# Altium footprint library Connector_art.PcbLib: 209 footprints (part 11 of 14)
Each footprint in its own frame and in the unit in brackets; x right, y up, seen from the top. Pads: shape width x height; smd on the part's side, far side on the other; paste and mask are expansions set on the pad; w line width, h text height; cw(c..) or ccw(c..) is an arc to the next point about the centre after c.
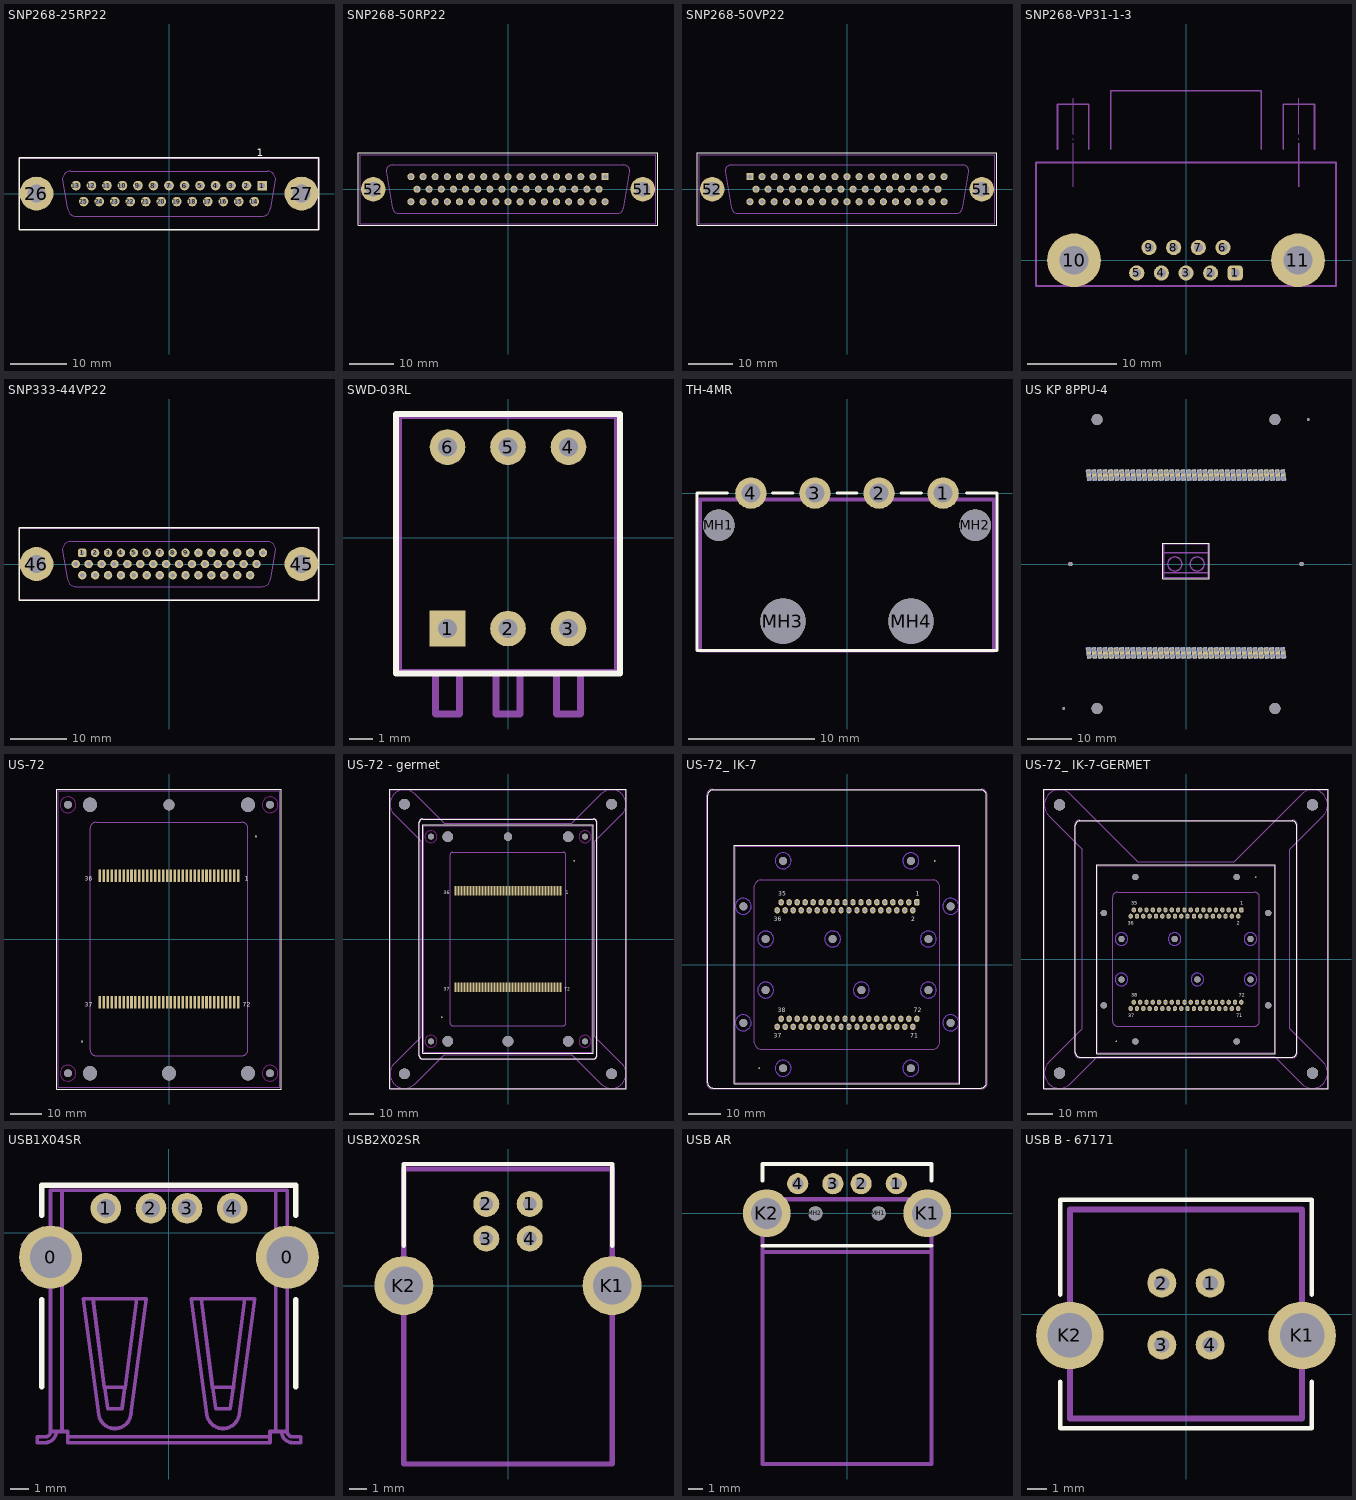
[diagram p10: the footprints below, top view; thin cyan lines are the x and y axes]

## SNP268-25RP22 [mm]
pads (27):
  rect 1.7x1.7 hole 1: 1(16.5,1.42)
  round 1.7 hole 1: 2(13.75,1.42) 3(11,1.42) 4(8.25,1.42) 5(5.5,1.42) 6(2.75,1.42) 7(0,1.42) 8(-2.75,1.42) 9(-5.5,1.42) 10(-8.25,1.42) 11(-11,1.42) 12(-13.75,1.42) 13(-16.5,1.42) 14(15.125,-1.42) 15(12.375,-1.42) 16(9.625,-1.42) 17(6.875,-1.42) 18(4.125,-1.42) 19(1.375,-1.42) 20(-1.375,-1.42) 21(-4.125,-1.42) 22(-6.875,-1.42) 23(-9.625,-1.42) 24(-12.375,-1.42) 25(-15.125,-1.42)
  round 6 hole 3.2: 26(-23.5,0) 27(23.5,0)
Top Overlay:
  lines w0.25: -26.6,-6.4 -26.6,6.4 26.6,6.4 26.6,6.3 26.6,-6.4 -26.6,-6.4
  text "1" at 15.56,6.655 h1.38
Mechanical 1:
  circle w0.13: c-23.5,0 r1.5
  circle w0.13: c23.5,0 r1.5
  lines w0.025: -26,0 -21,0 ; -23.5,-2.5 -23.5,2.5 ; 21,0 26,0 ; 23.5,-2.5 23.5,2.5
  lines w0.13: -18,-2.6 -18.9,2.5 cw(c-17.4,2.5) -17.4,4 17.4,4 cw(c17.4,2.5) 18.9,2.5 18,-2.7 ; -18,-2.5 ccw(c-16.5,-2.5) -16.5,-4 ; -16.6,-4 16.5,-4 ccw(c16.5,-2.5) 18,-2.5 ; -26.5,-6.3 -26.5,6.3 26.5,6.3 26.5,-6.3 -26.5,-6.3
  text "13" at -18.124,0.243 h2.12
  text "1" at 16.772,0.243 h2.12
  text "25" at -17.124,-2.757 h2.12
  text "14" at 14.876,-2.757 h2.12
3D body: height 12.4, standoff -3.2, extent -26.6,-6.25 26.6,6.25

## SNP268-50RP22 [mm]
pads (52):
  rect 1.6x1.6 hole 1: 1(22,2.84)
  round 1.6 hole 1: 2(19.25,2.84) 3(16.5,2.84) 4(13.75,2.84) 5(11,2.84) 6(8.25,2.84) 7(5.5,2.84) 8(2.75,2.84) 9(0,2.84) 10(-2.75,2.84) 11(-5.5,2.84) 12(-8.25,2.84) 13(-11,2.84) 14(-13.75,2.84) 15(-16.5,2.84) 16(-19.25,2.84) 17(-22,2.84) 18(20.625,0) 19(17.875,0) 20(15.125,0) 21(12.375,0) 22(9.625,0) 23(6.875,0) 24(4.125,0) 25(1.375,0) 26(-1.375,0) 27(-4.125,0) 28(-6.875,0) 29(-9.625,0) 30(-12.375,0) 31(-15.125,0) 32(-17.875,0) 33(-20.625,0) 34(22,-2.84) 35(19.25,-2.84) 36(16.5,-2.84) 37(13.75,-2.84) 38(11,-2.84) 39(8.25,-2.84) 40(5.5,-2.84) 41(2.75,-2.84) 42(0,-2.84) 43(-2.75,-2.84) 44(-5.5,-2.84) 45(-8.25,-2.84) 46(-11,-2.84) 47(-13.75,-2.84) 48(-16.5,-2.84) 49(-19.25,-2.84) 50(-22,-2.84)
  round 5.5 hole 3.2: 51(30.55,0) 52(-30.55,0)
Top Overlay:
  lines w0.25: -34,-8.2 34,-8.2 34,8.3 -34,8.3 -34,-8.2
Mechanical 1:
  lines w0.13: -26.2,-4.2 -27.65,4 cw(c-26.15,4) -26.15,5.5 ; -26.2,5.5 26.2,5.5 ; -26.193,-4.149 ccw(c-24.7,-4) -24.7,-5.5 24.7,-5.5 ccw(c24.7,-4) 26.193,-4.149 ; 26.15,5.5 cw(c26.15,4) 27.65,4 26.2,-4.2
  lines w0.2: -33.5,-7.8 33.5,-7.8 33.5,7.8 -33.5,7.8 -33.5,-7.8
  text "18" at 21.876,-1.457 h2.12
  text "33" at -24.124,-1.457 h2.12
  text "34" at 23.376,-3.957 h2.12
  text "50" at -25.124,-3.957 h2.12
  text "1" at 23.772,1.543 h2.12
  text "17" at -25.124,1.543 h2.12
3D body: height 12.4, standoff -3.2, extent -33.5,-7.7 33.5,7.7

## SNP268-50VP22 [mm]
pads (52):
  rect 1.6x1.6 hole 1: 1(-22,2.84)
  round 1.6 hole 1: 2(-19.25,2.84) 3(-16.5,2.84) 4(-13.75,2.84) 5(-11,2.84) 6(-8.25,2.84) 7(-5.5,2.84) 8(-2.75,2.84) 9(0,2.84) 10(2.75,2.84) 11(5.5,2.84) 12(8.25,2.84) 13(11,2.84) 14(13.75,2.84) 15(16.5,2.84) 16(19.25,2.84) 17(22,2.84) 18(-20.625,0) 19(-17.875,0) 20(-15.125,0) 21(-12.375,0) 22(-9.625,0) 23(-6.875,0) 24(-4.125,0) 25(-1.375,0) 26(1.375,0) 27(4.125,0) 28(6.875,0) 29(9.625,0) 30(12.375,0) 31(15.125,0) 32(17.875,0) 33(20.625,0) 34(-22,-2.84) 35(-19.25,-2.84) 36(-16.5,-2.84) 37(-13.75,-2.84) 38(-11,-2.84) 39(-8.25,-2.84) 40(-5.5,-2.84) 41(-2.75,-2.84) 42(0,-2.84) 43(2.75,-2.84) 44(5.5,-2.84) 45(8.25,-2.84) 46(11,-2.84) 47(13.75,-2.84) 48(16.5,-2.84) 49(19.25,-2.84) 50(22,-2.84)
  round 5.5 hole 3.2: 51(30.55,0) 52(-30.55,0)
Top Overlay:
  lines w0.25: -34,-8.2 -34,8.3 34,8.3 34,-8.2 -34,-8.2
Mechanical 1:
  lines w0.13: -26.2,-4.2 -27.65,4 cw(c-26.15,4) -26.15,5.5 ; -26.2,5.5 26.2,5.5 ; -26.193,-4.149 ccw(c-24.7,-4) -24.7,-5.5 24.7,-5.5 ccw(c24.7,-4) 26.193,-4.149 ; 26.15,5.5 cw(c26.15,4) 27.65,4 26.2,-4.2
  lines w0.2: -33.5,-7.8 -33.5,7.8 33.5,7.8 33.5,-7.8 -33.5,-7.8
  text "1" at -24.728,1.543 h2.12
  text "17" at 23.376,1.543 h2.12
  text "24" at -25.124,-3.957 h2.12
  text "50" at 23.376,-3.957 h2.12
  text "18" at -24.124,-1.457 h2.12
  text "33" at 21.876,-1.457 h2.12
3D body: height 12.4, standoff -4, extent -33.5,-7.855 33.5,7.845

## SNP268-VP31-1-3 [mm]
height 12.6
pads (11):
  rrect50% 1.7x1.7 hole 1: 1(5.5,-1.42)
  round 1.7 hole 1: 2(2.75,-1.42) 3(0,-1.42) 4(-2.75,-1.42) 5(-5.5,-1.42) 6(4.125,1.42) 7(1.375,1.42) 8(-1.375,1.42) 9(-4.125,1.42)
  round 6 hole 3.2: 10(-12.5,0) 11(12.5,0)
Mechanical 1:
  circle w0.2: c12.465,-0.055 r1.6
  circle w0.2: c-12.5,-0.08 r1.6
  lines w0.1: -14.62,0 -10.39,0 ; -12.6,8.22 -12.6,13.055 ; -12.6,13.485 -12.6,13.58 ; -12.6,14.095 -12.6,18.12 ; -12.5,2.32 -12.495,-2.32 ; 10.08,-0.005 14.875,0 ; 12.505,2.45 12.51,-2.42 ; 12.595,13.045 12.6,8.21 ; 12.595,13.475 12.595,13.57 ; 12.595,14.085 12.595,18.11
  lines w0.2: -14.35,12.42 -14.35,17.42 -10.85,17.42 -10.85,12.42 ; -8.4,12.42 -8.4,18.92 8.4,18.92 8.4,12.42 ; 10.85,12.42 10.85,17.42 14.35,17.42 14.35,12.42 ; -16.75,-2.88 16.75,-2.88 16.75,10.92 -16.75,10.92 -16.75,-2.88
  text "1" at 6.831,-2.224 h1.5
  text "5" at -8.149,-2.179 h1.5
  text "6" at 6.831,0.616 h1.5
  text "9" at -8.149,0.571 h1.5
Mechanical 2:
  circle w0.2: c12.47,-0.055 r1.6
  circle w0.2: c-12.5,-0.08 r1.6
  lines w0.1: -14.635,0 -10.375,0 ; -12.6,8.22 -12.6,13.055 ; -12.6,13.485 -12.6,13.58 ; -12.6,14.095 -12.6,18.12 ; -12.5,-2.265 -12.5,2.31 ; 10.09,0 14.875,0 ; 12.5,-2.32 12.505,2.42 ; 12.595,8.21 12.595,13.045 ; 12.595,13.475 12.595,13.57 ; 12.595,14.085 12.595,18.11
  lines w0.2: -14.35,12.42 -14.35,17.42 -10.85,17.42 -10.85,12.42 ; -8.4,12.42 -8.4,18.92 8.4,18.92 8.4,12.42 ; 10.85,12.42 10.85,17.42 14.35,17.42 14.35,12.42 ; -16.75,-2.88 16.75,-2.88 16.75,10.92 -16.75,10.92 -16.75,-2.88
3D body: height 14.21, standoff -2.59, extent -15.6,-3.33 15.6,17.87

## SNP333-44VP22 [mm]
pads (46):
  rrect50% 1.5x1.5 hole 0.8 unplated: 1(-15.39,1.98)
  round 1.5 hole 0.8: 2(-13.1,1.98) 3(-10.81,1.98) 4(-8.52,1.98) 5(-6.23,1.98) 6(-3.94,1.98) 7(-1.65,1.98) 8(0.64,1.98) 9(2.93,1.98) 10(5.22,1.98) 11(7.51,1.98) 12(9.8,1.98) 13(12.09,1.98) 14(14.38,1.98) 15(16.67,1.98) 16(-16.54,0) 17(-14.25,0) 18(-11.96,0) 19(-9.67,0) 20(-7.38,0) 21(-5.09,0) 22(-2.8,0) 23(-0.51,0) 24(1.78,0) 25(4.07,0) 26(6.36,0) 27(8.65,0) 28(10.94,0) 29(13.23,0) 30(15.52,0) 31(-15.39,-1.98) 32(-13.1,-1.98) 33(-10.81,-1.98) 34(-8.52,-1.98) 35(-6.23,-1.98) 36(-3.94,-1.98) 37(-1.65,-1.98) 38(0.64,-1.98) 39(2.93,-1.98) 40(5.22,-1.98) 41(7.51,-1.98) 42(9.8,-1.98) 43(12.09,-1.98) 44(14.38,-1.98)
  round 6 hole 3.2: 45(23.5,0) 46(-23.5,0)
Top Overlay:
  lines w0.25: -26.6,-6.4 -26.6,6.4 26.6,6.4 26.6,6.3 26.6,-6.4 -26.6,-6.4
Mechanical 1:
  circle w0.13: c-23.5,0 r1.5
  circle w0.13: c23.5,0 r1.5
  lines w0.025: -26,0 -21,0 ; -23.5,-2.5 -23.5,2.5 ; 21,0 26,0 ; 23.5,-2.5 23.5,2.5
  lines w0.13: -18,-2.6 -18.9,2.5 cw(c-17.4,2.5) -17.4,4 17.4,4 cw(c17.4,2.5) 18.9,2.5 18,-2.7 ; -18,-2.5 ccw(c-16.5,-2.5) -16.5,-4 ; -16.6,-4 16.5,-4 ccw(c16.5,-2.5) 18,-2.5 ; -26.5,-6.3 -26.5,6.3 26.5,6.3 26.5,-6.3 -26.5,-6.3
  text "16" at -18.124,-1.257 h2.12
  text "30" at 15.376,-1.257 h2.12
  text "1" at -17.228,0.743 h2.12
  text "15" at 15.876,0.743 h2.12
  text "31" at -17.124,-3.257 h2.12
  text "44" at 14.376,-3.257 h2.12

## SWD-03RL [mm]
height 10.3
pads (6):
  rect 1.5x1.5 hole 0.8 paste+0: 1(-2.54,-3.81)
  round 1.5 hole 0.8: 2(0,-3.81) 3(2.54,-3.81) 4(2.54,3.81) 5(0,3.81) 6(-2.54,3.81)
Top Overlay:
  lines w0.25: -4.7,-5.7 4.7,-5.7 4.7,5.2 -4.7,5.2 -4.7,-5.7
Mechanical 1:
  lines w0.3: -3.04,-5.65 -3.04,-7.4 -2.04,-7.4 -2.04,-5.65 ; -0.5,-5.65 -0.5,-7.4 0.5,-7.4 0.5,-5.65 ; 2.04,-5.65 2.04,-7.4 3.04,-7.4 3.04,-5.65 ; -4.6,-5.65 4.6,-5.65 4.6,5.15 -4.6,5.15 -4.6,-5.65
3D body: height 10.3, standoff -3.2, extent -4.6,-7.35 4.6,5.15

## TH-4MR [mm]
height 8.3
pads (8):
  round 2.5 hole 1.5: 1(7.62,0) 2(2.54,0) 3(-2.54,0) 4(-7.62,0)
  round 2.5 hole 2.5 unplated: MH1(-10.16,-2.54) MH2(10.16,-2.54)
  round 3.6 hole 3.6 unplated: MH3(-5.08,-10.16) MH4(5.08,-10.16)
Top Overlay:
  lines w0.25: -9.5,0 -11.9,0 -11.9,-12.5 11.9,-12.5 11.9,0 9.5,0 ; -5.9,0 -4.3,0 ; -0.8,0 0.8,0 ; 4.3,0 5.9,0
Mechanical 1:
  lines w0.3: -11.65,-12.5 -11.65,-0.5 11.65,-0.5 11.65,-12.5 -11.65,-12.5
3D body: height 8.3, standoff -4.15, extent -11.65,-12.5 11.65,0.5

## US KP 8PPU-4 [mm]
height 10
pads (296):
  round 1 hole 0.85: 1(21.8,20.625) 1(21.95,19.375) 2(20.55,20.625) 2(20.7,19.375) 3(19.3,20.625) 3(19.45,19.375) 4(18.05,20.625) 4(18.2,19.375) 5(16.8,20.625) 5(16.95,19.375) 6(15.55,20.625) 6(15.7,19.375) 7(14.3,20.625) 7(14.45,19.375) 8(13.05,20.625) 8(13.2,19.375) 9(11.8,20.625) 9(11.95,19.375) 10(10.55,20.625) 10(10.7,19.375) 11(9.3,20.625) 11(9.45,19.375) 12(8.05,20.625) 12(8.2,19.375) 13(6.8,20.625) 13(6.95,19.375) 14(5.55,20.625) 14(5.7,19.375) 15(4.3,20.625) 15(4.45,19.375) 16(3.05,20.625) 16(3.2,19.375) 17(1.8,20.625) 17(1.95,19.375) 18(0.55,20.625) 18(0.7,19.375) 19(-0.7,20.625) 19(-0.55,19.375) 20(-1.95,20.625) 20(-1.8,19.375) 21(-3.2,20.625) 21(-3.05,19.375) 22(-4.45,20.625) 22(-4.3,19.375) 23(-5.7,20.625) 23(-5.55,19.375) 24(-6.95,20.625) 24(-6.8,19.375) 25(-8.2,20.625) 25(-8.05,19.375) 26(-9.45,20.625) 26(-9.3,19.375) 27(-10.7,20.625) 27(-10.55,19.375) 28(-11.95,20.625) 28(-11.8,19.375) 29(-13.2,20.625) 29(-13.05,19.375) 30(-14.45,20.625) 30(-14.3,19.375) 31(-15.7,20.625) 31(-15.55,19.375) 32(-16.95,20.625) 32(-16.8,19.375) 33(-18.2,20.625) 33(-18.05,19.375) 34(-19.45,20.625) 34(-19.3,19.375) 35(-20.7,20.625) 35(-20.55,19.375) 36(-21.95,20.625) 36(-21.8,19.375) 37(-21.95,-19.375) 37(-21.8,-20.625) 38(-20.7,-19.375) 38(-20.55,-20.625) 39(-19.45,-19.375) 39(-19.3,-20.625) 40(-18.2,-19.375) 40(-18.05,-20.625) 41(-16.95,-19.375) 41(-16.8,-20.625) 42(-15.7,-19.375) 42(-15.55,-20.625) 43(-14.45,-19.375) 43(-14.3,-20.625) 44(-13.2,-19.375) 44(-13.05,-20.625) 45(-11.95,-19.375) 45(-11.8,-20.625) 46(-10.7,-19.375) 46(-10.55,-20.625) 47(-9.45,-19.375) 47(-9.3,-20.625) 48(-8.2,-19.375) 48(-8.05,-20.625) 49(-6.95,-19.375) 49(-6.8,-20.625) 50(-5.7,-19.375) 50(-5.55,-20.625) 51(-4.45,-19.375) 51(-4.3,-20.625) 52(-3.2,-19.375) 52(-3.05,-20.625) 53(-1.95,-19.375) 53(-1.8,-20.625) 54(-0.7,-19.375) 54(-0.55,-20.625) 55(0.55,-19.375) 55(0.7,-20.625) 56(1.8,-19.375) 56(1.95,-20.625) 57(3.05,-19.375) 57(3.2,-20.625) 58(4.3,-19.375) 58(4.45,-20.625) 59(5.55,-19.375) 59(5.7,-20.625) 60(6.8,-19.375) 60(6.95,-20.625) 61(8.05,-19.375) 61(8.2,-20.625) 62(9.3,-19.375) 62(9.45,-20.625) 63(10.55,-19.375) 63(10.7,-20.625) 64(11.8,-19.375) 64(11.95,-20.625) 65(13.05,-19.375) 65(13.2,-20.625) 66(14.3,-19.375) 66(14.45,-20.625) 67(15.55,-19.375) 67(15.7,-20.625) 68(16.8,-19.375) 68(16.95,-20.625) 69(18.05,-19.375) 69(18.2,-20.625) 70(19.3,-19.375) 70(19.45,-20.625) 71(20.55,-19.375) 71(20.7,-20.625) 72(21.8,-19.375) 72(21.95,-20.625)
  rrect50% 1.05x2.6 smd rot 7: 1(21.875,20) 2(20.625,20) 3(19.375,20) 4(18.125,20) 5(16.875,20) 6(15.625,20) 7(14.375,20) 8(13.125,20) 9(11.875,20) 10(10.625,20) 11(9.375,20) 12(8.125,20) 13(6.875,20) 14(5.625,20) 15(4.375,20) 16(3.125,20) 17(1.875,20) 18(0.625,20) 19(-0.625,20) 20(-1.875,20) 21(-3.125,20) 22(-4.375,20) 23(-5.625,20) 24(-6.875,20) 25(-8.125,20) 26(-9.375,20) 27(-10.625,20) 28(-11.875,20) 29(-13.125,20) 30(-14.375,20) 31(-15.625,20) 32(-16.875,20) 33(-18.125,20) 34(-19.375,20) 35(-20.625,20) 36(-21.875,20) 37(-21.875,-20) 38(-20.625,-20) 39(-19.375,-20) 40(-18.125,-20) 41(-16.875,-20) 42(-15.625,-20) 43(-14.375,-20) 44(-13.125,-20) 45(-11.875,-20) 46(-10.625,-20) 47(-9.375,-20) 48(-8.125,-20) 49(-6.875,-20) 50(-5.625,-20) 51(-4.375,-20) 52(-3.125,-20) 53(-1.875,-20) 54(-0.625,-20) 55(0.625,-20) 56(1.875,-20) 57(3.125,-20) 58(4.375,-20) 59(5.625,-20) 60(6.875,-20) 61(8.125,-20) 62(9.375,-20) 63(10.625,-20) 64(11.875,-20) 65(13.125,-20) 66(14.375,-20) 67(15.625,-20) 68(16.875,-20) 69(18.125,-20) 70(19.375,-20) 71(20.625,-20) 72(21.875,-20)
  rrect50% 1.05x2.6 smd far side rot 7: 01(21.875,20) 02(20.625,20) 03(19.375,20) 04(18.125,20) 05(16.875,20) 06(15.625,20) 07(14.375,20) 08(13.125,20) 09(11.875,20) 10(10.625,20) 11(9.375,20) 12(8.125,20) 13(6.875,20) 14(5.625,20) 15(4.375,20) 16(3.125,20) 17(1.875,20) 18(0.625,20) 19(-0.625,20) 20(-1.875,20) 21(-3.125,20) 22(-4.375,20) 23(-5.625,20) 24(-6.875,20) 25(-8.125,20) 26(-9.375,20) 27(-10.625,20) 28(-11.875,20) 29(-13.125,20) 30(-14.375,20) 31(-15.625,20) 32(-16.875,20) 33(-18.125,20) 34(-19.375,20) 35(-20.625,20) 36(-21.875,20) 37(-21.875,-20) 38(-20.625,-20) 39(-19.375,-20) 40(-18.125,-20) 41(-16.875,-20) 42(-15.625,-20) 43(-14.375,-20) 44(-13.125,-20) 45(-11.875,-20) 46(-10.625,-20) 47(-9.375,-20) 48(-8.125,-20) 49(-6.875,-20) 50(-5.625,-20) 51(-4.375,-20) 52(-3.125,-20) 53(-1.875,-20) 54(-0.625,-20) 55(0.625,-20) 56(1.875,-20) 57(3.125,-20) 58(4.375,-20) 59(5.625,-20) 60(6.875,-20) 61(8.125,-20) 62(9.375,-20) 63(10.625,-20) 64(11.875,-20) 65(13.125,-20) 66(14.375,-20) 67(15.625,-20) 68(16.875,-20) 69(18.125,-20) 70(19.375,-20) 71(20.625,-20) 72(21.875,-20)
  round 0.6 hole 0.6: MH06(-27.5,-32.5) MH06(27.5,32.5)
  round 1 hole 1 unplated: MH10(-26,0) MH10(26,0)
  round 2.5 hole 2.5 unplated: MH25(-20,-32.5) MH25(-20,32.5) MH25(20,-32.5) MH25(20,32.5)
Top Overlay:
  lines w0.25: -5.2,-3.3 -5.2,4.7 5.2,4.7 5.2,-3.3 -5.2,-3.3
Mechanical 1:
  circle w0.3: c-2.5,0 r1.6
  circle w0.3: c2.5,0 r1.6
  lines w0.3: -5,-2 5,-2 ; -5,2.5 5,2.5 ; -5,-3.1 -5,4.5 5,4.5 5,-3.1 -5,-3.1

## US-72 [mm]
pads (84):
  rect 0.8x4 smd: 1(21.875,20) 2(20.625,20) 3(19.375,20) 4(18.125,20) 5(16.875,20) 6(15.625,20) 7(14.375,20) 8(13.125,20) 9(11.875,20) 10(10.625,20) 11(9.375,20) 12(8.125,20) 13(6.875,20) 14(5.625,20) 15(4.375,20) 16(3.125,20) 17(1.875,20) 18(0.625,20) 19(-0.625,20) 20(-1.875,20) 21(-3.125,20) 22(-4.375,20) 23(-5.625,20) 24(-6.875,20) 25(-8.125,20) 26(-9.375,20) 27(-10.625,20) 28(-11.875,20) 29(-13.125,20) 30(-14.375,20) 31(-15.625,20) 32(-16.875,20) 33(-18.125,20) 34(-19.375,20) 35(-20.625,20) 36(-21.875,20) 37(-21.875,-20) 38(-20.625,-20) 39(-19.375,-20) 40(-18.125,-20) 41(-16.875,-20) 42(-15.625,-20) 43(-14.375,-20) 44(-13.125,-20) 45(-11.875,-20) 46(-10.625,-20) 47(-9.375,-20) 48(-8.125,-20) 49(-6.875,-20) 50(-5.625,-20) 51(-4.375,-20) 52(-3.125,-20) 53(-1.875,-20) 54(-0.625,-20) 55(0.625,-20) 56(1.875,-20) 57(3.125,-20) 58(4.375,-20) 59(5.625,-20) 60(6.875,-20) 61(8.125,-20) 62(9.375,-20) 63(10.625,-20) 64(11.875,-20) 65(13.125,-20) 66(14.375,-20) 67(15.625,-20) 68(16.875,-20) 69(18.125,-20) 70(19.375,-20) 71(20.625,-20) 72(21.875,-20)
  round 0.6 hole 0.6 unplated: MH06(-27.5,-32.5) MH06(27.5,32.5)
  round 2.5 hole 2.5 unplated: MH25(-32,-42.5) MH25(-32,42.5) MH25(32,-42.5) MH25(32,42.5)
  round 3.5 hole 3.5 unplated: MH35(0,42.5)
  round 4.5 hole 4.5 unplated: MH45(-25,-42.5) MH45(-25,42.5) MH45(0,-42.5) MH45(25,-42.5) MH45(25,42.5)
Top Layer keep-out:
  circle w0.25: c-32,42.5 r2.5
  circle w0.25: c32,42.5 r2.5
  circle w0.25: c32,-42.5 r2.5
  circle w0.25: c-32,-42.5 r2.5
Top Overlay:
  lines w0.25: -35.5,-47.5 -35.5,47.5 35.5,47.5 35.5,-47.5 -35.5,-47.5
  text "37" at -26.638,-21.5 h1.38
  text "36" at -26.638,18.5 h1.38
  text "72" at 23.363,-21.5 h1.38
  text "1" at 24.05,18.5 h1.38
Bottom Overlay:
  lines w0.25: -35.5,-47.5 -35.5,47.5 35.5,47.5 35.5,-47.5 -35.5,-47.5 ; -24.5,-35 ccw(c-23,-35) -23,-36.5 23,-36.5 ccw(c23,-35) 24.5,-35 24.5,35 ccw(c23,35) 23,36.5 -23,36.5 ccw(c-23,35) -24.5,35 -24.5,-35
Top Solder:
  circle w2.5: c-31.98,-42.5 r1.25
  circle w2.5: c32.02,-42.5 r1.25
  circle w2.5: c32.02,42.5 r1.25
  circle w2.5: c-31.98,42.5 r1.25
Mechanical 1:
  lines w0.2: -35,-47 -35,47 35,47 35,-47 -35,-47
  text "37" at -25.124,-21.5 h2.12
  text "36" at -25.124,19 h2.12
  text "72" at 22.876,-21.5 h2.12
  text "1" at 22.772,19 h2.12
Mechanical 2:
  lines w0.2: -35,-47 -35,47 35,47 35,-47 -35,-47 ; -25,-35 ccw(c-23,-35) -23,-37 23,-37 ccw(c23,-35) 25,-35 25,35 ccw(c23,35) 23,37 -23,37 ccw(c-23,35) -25,35 -25,-35

## US-72 - germet [mm]
pads (88):
  rect 0.8x4 smd: 1(21.875,20) 2(20.625,20) 3(19.375,20) 4(18.125,20) 5(16.875,20) 6(15.625,20) 7(14.375,20) 8(13.125,20) 9(11.875,20) 10(10.625,20) 11(9.375,20) 12(8.125,20) 13(6.875,20) 14(5.625,20) 15(4.375,20) 16(3.125,20) 17(1.875,20) 18(0.625,20) 19(-0.625,20) 20(-1.875,20) 21(-3.125,20) 22(-4.375,20) 23(-5.625,20) 24(-6.875,20) 25(-8.125,20) 26(-9.375,20) 27(-10.625,20) 28(-11.875,20) 29(-13.125,20) 30(-14.375,20) 31(-15.625,20) 32(-16.875,20) 33(-18.125,20) 34(-19.375,20) 35(-20.625,20) 36(-21.875,20) 37(-21.875,-20) 38(-20.625,-20) 39(-19.375,-20) 40(-18.125,-20) 41(-16.875,-20) 42(-15.625,-20) 43(-14.375,-20) 44(-13.125,-20) 45(-11.875,-20) 46(-10.625,-20) 47(-9.375,-20) 48(-8.125,-20) 49(-6.875,-20) 50(-5.625,-20) 51(-4.375,-20) 52(-3.125,-20) 53(-1.875,-20) 54(-0.625,-20) 55(0.625,-20) 56(1.875,-20) 57(3.125,-20) 58(4.375,-20) 59(5.625,-20) 60(6.875,-20) 61(8.125,-20) 62(9.375,-20) 63(10.625,-20) 64(11.875,-20) 65(13.125,-20) 66(14.375,-20) 67(15.625,-20) 68(16.875,-20) 69(18.125,-20) 70(19.375,-20) 71(20.625,-20) 72(21.875,-20)
  round 0.6 hole 0.6 unplated: MH06(-27.5,-32.5) MH06(27.5,32.5)
  round 2.5 hole 2.5 unplated: MH25(-32,-42.5) MH25(-32,42.5) MH25(32,-42.5) MH25(32,42.5)
  round 3.5 hole 3.5 unplated: MH35(0,42.5)
  round 4.5 hole 4.5 unplated: MH45(-43,-56) MH45(-43,56) MH45(-25,-42.5) MH45(-25,42.5) MH45(0,-42.5) MH45(25,-42.5) MH45(25,42.5) MH45(43,-56) MH45(43,56)
Top Layer keep-out:
  circle w0.25: c-32,42.5 r2.5
  circle w0.25: c32,42.5 r2.5
  circle w0.25: c32,-42.5 r2.5
  circle w0.25: c-32,-42.5 r2.5
Top Overlay:
  lines w0.25: -36.8,-48.5 -36.8,48.5 ; -35.5,-49.8 35.5,-49.8 ; -35.5,49.8 35.5,49.8 ; 36.8,-48.5 36.8,48.5 ; -49.2,-62.2 -49.2,62.2 49.2,62.2 49.2,-62.2 -49.2,-62.2 ; -35.5,-47.5 -35.5,47.5 35.5,47.5 35.5,-47.5 -35.5,-47.5
  lines w0.254: -36.8,-48.5 ccw(c-35.5,-48.5) -35.5,-49.8 ; -36.8,48.5 cw(c-35.5,48.5) -35.5,49.8 ; 35.5,-49.8 ccw(c35.5,-48.5) 36.8,-48.5 ; 35.5,49.8 cw(c35.5,48.5) 36.8,48.5
  text "37" at -26.638,-21.5 h1.38
  text "36" at -26.638,18.5 h1.38
  text "72" at 23.363,-21.5 h1.38
  text "1" at 24.05,18.5 h1.38
Bottom Overlay:
  lines w0.25: -47.455,-51.545 ccw(c-43,-56) -38.545,-60.455 ; -47.455,51.545 cw(c-43,56) -38.545,60.455 ; -47.45,-51.55 -36.3,-40.4 -36.3,40.4 -47.45,51.55 ; -38.55,-60.45 -26.4,-48.3 26.4,-48.3 38.55,-60.45 ; -38.55,60.45 -26.4,48.3 26.4,48.3 38.55,60.45 ; 38.545,-60.455 ccw(c43,-56) 47.455,-51.545 ; 38.545,60.455 cw(c43,56) 47.455,51.545 ; 47.45,-51.55 36.3,-40.4 36.3,40.4 47.45,51.55 ; -23.7,-35 ccw(c-23,-35) -23,-35.7 23,-35.7 ccw(c23,-35) 23.7,-35 23.7,35 ccw(c23,35) 23,35.7 -23,35.7 ccw(c-23,35) -23.7,35 -23.7,-35
Top Solder:
  circle w2.5: c-31.98,42.5 r1.25
  circle w2.5: c32.02,42.5 r1.25
  circle w2.5: c32.02,-42.5 r1.25
  circle w2.5: c-31.98,-42.5 r1.25
Mechanical 1:
  lines w0.2: -49,-62 -49,62 49,62 49,-62 -49,-62 ; -37,-48.5 ccw(c-35.5,-48.5) -35.5,-50 35.5,-50 ccw(c35.5,-48.5) 37,-48.5 37,48.5 ccw(c35.5,48.5) 35.5,50 -35.5,50 ccw(c-35.5,48.5) -37,48.5 -37,-48.5 ; -35,-47 -35,47 35,47 35,-47 -35,-47
  text "37" at -25.124,-21.5 h2.12
  text "36" at -25.124,19 h2.12
  text "72" at 22.876,-21.5 h2.12
  text "1" at 22.772,19 h2.12
Mechanical 2:
  lines w0.2: -47.25,-51.75 -36,-40.5 -36,40.5 -47.25,51.75 ; -47.243,-51.757 ccw(c-43,-56) -38.757,-60.243 ; -47.243,51.757 cw(c-43,56) -38.757,60.243 ; -38.75,-60.25 -26.5,-48 26.5,-48 38.75,-60.25 ; -38.75,60.25 -26.5,48 26.5,48 38.75,60.25 ; 38.757,-60.243 ccw(c43,-56) 47.243,-51.757 ; 38.757,60.243 cw(c43,56) 47.243,51.757 ; 47.25,-51.75 36,-40.5 36,40.5 47.25,51.75 ; -24,-35 ccw(c-23,-35) -23,-36 23,-36 ccw(c23,-35) 24,-35 24,35 ccw(c23,35) 23,36 -23,36 ccw(c-23,35) -24,35 -24,-35
3D body: height 11, standoff -16.5, extent -49,-62 49,62

## US-72_ IK-7 [mm]
height 10
pads (88):
  rrect50% 1.7x2 hole 1.1: 1(21.875,19.5)
  oval 1.7x2 hole 1.1: 2(20.625,17) 3(19.375,19.5) 4(18.125,17) 5(16.875,19.5) 6(15.625,17) 7(14.375,19.5) 8(13.125,17) 9(11.875,19.5) 10(10.625,17) 11(9.375,19.5) 12(8.125,17) 13(6.875,19.5) 14(5.625,17) 15(4.375,19.5) 16(3.125,17) 17(1.875,19.5) 18(0.625,17) 19(-0.625,19.5) 20(-1.875,17) 21(-3.125,19.5) 22(-4.375,17) 23(-5.625,19.5) 24(-6.875,17) 25(-8.125,19.5) 26(-9.375,17) 27(-10.625,19.5) 28(-11.875,17) 29(-13.125,19.5) 30(-14.375,17) 31(-15.625,19.5) 32(-16.875,17) 33(-18.125,19.5) 34(-19.375,17) 35(-20.625,19.5) 36(-21.875,17) 37(-21.875,-19.5) 38(-20.625,-17) 39(-19.375,-19.5) 40(-18.125,-17) 41(-16.875,-19.5) 42(-15.625,-17) 43(-14.375,-19.5) 44(-13.125,-17) 45(-11.875,-19.5) 46(-10.625,-17) 47(-9.375,-19.5) 48(-8.125,-17) 49(-6.875,-19.5) 50(-5.625,-17) 51(-4.375,-19.5) 52(-3.125,-17) 53(-1.875,-19.5) 54(-0.625,-17) 55(0.625,-19.5) 56(1.875,-17) 57(3.125,-19.5) 58(4.375,-17) 59(5.625,-19.5) 60(6.875,-17) 61(8.125,-19.5) 62(9.375,-17) 63(10.625,-19.5) 64(11.875,-17) 65(13.125,-19.5) 66(14.375,-17) 67(15.625,-19.5) 68(16.875,-17) 69(18.125,-19.5) 70(19.375,-17) 71(20.625,-19.5) 72(21.875,-17)
  round 0.6 hole 0.6 unplated: MH06(-27.5,-32.5) MH06(27.5,32.5)
  round 2.5 hole 2.5 unplated: MH25(-32.5,-18.25) MH25(-32.5,18.25) MH25(-25.5,-8) MH25(-25.5,8) MH25(-20,-32.5) MH25(-20,32.5) MH25(-4.5,8) MH25(4.5,-8) MH25(20,-32.5) MH25(20,32.5) MH25(25.5,-8) MH25(25.5,8) MH25(32.5,-18.25) MH25(32.5,18.25)
Bottom Layer keep-out:
  circle w0.254: c-25.5,-8 r2.5
  circle w0.254: c-25.5,8 r2.5
  circle w0.254: c-4.5,8 r2.5
  circle w0.254: c25.5,8 r2.5
  circle w0.254: c25.5,-8 r2.5
  circle w0.254: c4.5,-8 r2.5
  circle w0.254: c-32.5,-18.25 r2.5
  circle w0.254: c-32.5,18.25 r2.5
  circle w0.254: c-20,32.5 r2.5
  circle w0.254: c20,32.5 r2.5
  circle w0.254: c32.5,18.25 r2.5
  circle w0.254: c32.5,-18.25 r2.5
  circle w0.254: c20,-32.5 r2.5
  circle w0.254: c-20,-32.5 r2.5
Top Overlay:
  lines w0.25: -43.7,-37 ccw(c-42,-37) -42,-38.7 42,-38.7 ccw(c42,-37) 43.7,-37 43.7,53 ccw(c42,53) 42,54.7 -42,54.7 ccw(c-42,53) -43.7,53 -43.7,-37 ; -35.3,-37.3 35.3,-37.3 35.3,37.3 -35.3,37.3 -35.3,-37.3
  text "1" at 21.5,21.5 h1.38
  text "2" at 20.1,13.6 h1.38
  text "36" at -23,13.6 h1.38
  text "35" at -21.6,21.6 h1.38
  text "38" at -21.7,-14.9 h1.38
  text "37" at -22.9,-23 h1.38
  text "72" at 20.9,-14.9 h1.38
  text "71" at 19.8,-23 h1.38
Bottom Overlay:
  lines w0.25: -28.7,-24.5 -28.7,24.5 ; -27,-26.2 27,-26.2 ; -27,26.2 27,26.2 ; 28.7,-24.5 28.7,24.5 ; 41.3,-27.4 41.311,-27.411
  lines w0.254: -28.7,-24.5 ccw(c-27,-24.5) -27,-26.2 ; -28.7,24.5 cw(c-27,24.5) -27,26.2 ; 27,-26.2 ccw(c27,-24.5) 28.7,-24.5 ; 27,26.2 cw(c27,24.5) 28.7,24.5
  text "72" at 23.1,-14.9 h1.38
  text "71" at 21.4,-23 h1.38
  text "37" at -20.8,-23 h1.38
  text "38" at -19.6,-14.9 h1.38
  text "36" at -20.9,13.6 h1.38
  text "35" at -19.5,21.6 h1.38
  text "2" at 21,13.6 h1.38
  text "1" at 22.2,21.5 h1.38
Bottom Solder:
  circle w2.5: c4.52,-8 r1.25
  circle w2.5: c25.52,-8 r1.25
  circle w2.5: c25.52,8 r1.25
  circle w2.5: c-4.48,8 r1.25
  circle w2.5: c-25.48,8 r1.25
  circle w2.5: c-25.48,-8 r1.25
  circle w2.5: c-32.48,-18.25 r1.25
  circle w2.5: c-32.48,18.25 r1.25
  circle w2.5: c-19.98,32.5 r1.25
  circle w2.5: c20.02,32.5 r1.25
  circle w2.5: c32.52,18.25 r1.25
  circle w2.5: c32.52,-18.25 r1.25
  circle w2.5: c20.02,-32.5 r1.25
  circle w2.5: c-19.98,-32.5 r1.25
Mechanical 1:
  lines w0.3: -44,-37 ccw(c-42,-37) -42,-39 42,-39 ccw(c42,-37) 44,-37 44,53 ccw(c42,53) 42,55 -42,55 ccw(c-42,53) -44,53 -44,-37 ; -35,-37 35,-37 35,37 -35,37 -35,-37
Mechanical 2:
  lines w0.3: -29,-24.5 ccw(c-27,-24.5) -27,-26.5 27,-26.5 ccw(c27,-24.5) 29,-24.5 29,24.5 ccw(c27,24.5) 27,26.5 -27,26.5 ccw(c-27,24.5) -29,24.5 -29,-24.5
3D body: height 30, standoff -3.4, extent -41.5,-37 41.5,53

## US-72_ IK-7-GERMET [mm]
height 10
pads (92):
  rrect50% 1.7x2 hole 1.1: 1(21.875,19.5)
  oval 1.7x2 hole 1.1: 2(20.625,17) 3(19.375,19.5) 4(18.125,17) 5(16.875,19.5) 6(15.625,17) 7(14.375,19.5) 8(13.125,17) 9(11.875,19.5) 10(10.625,17) 11(9.375,19.5) 12(8.125,17) 13(6.875,19.5) 14(5.625,17) 15(4.375,19.5) 16(3.125,17) 17(1.875,19.5) 18(0.625,17) 19(-0.625,19.5) 20(-1.875,17) 21(-3.125,19.5) 22(-4.375,17) 23(-5.625,19.5) 24(-6.875,17) 25(-8.125,19.5) 26(-9.375,17) 27(-10.625,19.5) 28(-11.875,17) 29(-13.125,19.5) 30(-14.375,17) 31(-15.625,19.5) 32(-16.875,17) 33(-18.125,19.5) 34(-19.375,17) 35(-20.625,19.5) 36(-21.875,17) 37(-21.875,-19.5) 38(-20.625,-17) 39(-19.375,-19.5) 40(-18.125,-17) 41(-16.875,-19.5) 42(-15.625,-17) 43(-14.375,-19.5) 44(-13.125,-17) 45(-11.875,-19.5) 46(-10.625,-17) 47(-9.375,-19.5) 48(-8.125,-17) 49(-6.875,-19.5) 50(-5.625,-17) 51(-4.375,-19.5) 52(-3.125,-17) 53(-1.875,-19.5) 54(-0.625,-17) 55(0.625,-19.5) 56(1.875,-17) 57(3.125,-19.5) 58(4.375,-17) 59(5.625,-19.5) 60(6.875,-17) 61(8.125,-19.5) 62(9.375,-17) 63(10.625,-19.5) 64(11.875,-17) 65(13.125,-19.5) 66(14.375,-17) 67(15.625,-19.5) 68(16.875,-17) 69(18.125,-19.5) 70(19.375,-17) 71(20.625,-19.5) 72(21.875,-17)
  round 0.6 hole 0.6 unplated: MH06(-27.5,-32.5) MH06(27.5,32.5)
  round 2.5 hole 2.5 unplated: MH25(-32.5,-18.25) MH25(-32.5,18.25) MH25(-25.5,-8) MH25(-25.5,8) MH25(-20,-32.5) MH25(-20,32.5) MH25(-4.5,8) MH25(4.5,-8) MH25(20,-32.5) MH25(20,32.5) MH25(25.5,-8) MH25(25.5,8) MH25(32.5,-18.25) MH25(32.5,18.25)
  round 4.5 hole 4.5 unplated: MH45(-50,-45) MH45(-50,61) MH45(50,-45) MH45(50,61)
Bottom Layer keep-out:
  circle w0.254: c-25.5,-8 r2.5
  circle w0.254: c4.5,-8 r2.5
  circle w0.254: c25.5,-8 r2.5
  circle w0.254: c25.5,8 r2.5
  circle w0.254: c-4.5,8 r2.5
  circle w0.254: c-25.5,8 r2.5
Top Overlay:
  lines w0.25: -56.3,-51.3 -56.3,67.3 56.3,67.3 56.3,-51.3 -56.3,-51.3 ; -43.7,-37 ccw(c-42,-37) -42,-38.7 42,-38.7 ccw(c42,-37) 43.7,-37 43.7,53 ccw(c42,53) 42,54.7 -42,54.7 ccw(c-42,53) -43.7,53 -43.7,-37 ; -35.3,-37.3 -35.3,37.3 35.3,37.3 35.3,-37.3 -35.3,-37.3
  text "71" at 19.8,-23 h1.38
  text "72" at 20.9,-14.9 h1.38
  text "37" at -22.9,-23 h1.38
  text "38" at -21.7,-14.9 h1.38
  text "35" at -21.6,21.6 h1.38
  text "36" at -23,13.6 h1.38
  text "2" at 20.1,13.6 h1.38
  text "1" at 21.5,21.5 h1.38
Bottom Overlay:
  lines w0.25: -54.455,-40.545 ccw(c-50,-45) -45.495,-49.404 ; -54.45,-40.55 -41.3,-27.4 -41.3,43.4 -54.4,56.5 ; -54.404,56.495 cw(c-50,61) -45.545,65.455 ; -45.55,65.45 -18.9,38.8 18.9,38.8 45.5,65.4 ; -45.5,-49.4 -34.9,-38.8 34.882,-38.8 ; -28.7,-24.5 -28.7,24.5 ; -27,-26.2 27,-26.2 ; -27,26.2 27,26.2 ; 28.7,-24.5 28.7,24.5 ; 34.891,-38.791 45.5,-49.4 ; 41.311,-27.411 41.3,-27.4 ; 45.495,-49.404 ccw(c50,-45) 54.455,-40.545 ; 45.495,65.404 cw(c50,61) 54.455,56.545 ; 54.45,-40.55 41.3,-27.4 ; 54.45,56.55 41.3,43.4 41.3,-27.4 ; -54.4,56.5 -54.4,56.5
  lines w0.254: -28.7,-24.5 ccw(c-27,-24.5) -27,-26.2 ; -28.7,24.5 cw(c-27,24.5) -27,26.2 ; 27,-26.2 ccw(c27,-24.5) 28.7,-24.5 ; 27,26.2 cw(c27,24.5) 28.7,24.5
  text "1" at 22.2,21.5 h1.38
  text "2" at 21,13.6 h1.38
  text "35" at -19.5,21.6 h1.38
  text "36" at -20.9,13.6 h1.38
  text "38" at -19.6,-14.9 h1.38
  text "37" at -20.8,-23 h1.38
  text "71" at 21.4,-23 h1.38
  text "72" at 23.1,-14.9 h1.38
Bottom Solder:
  circle w2.5: c-25.48,-8 r1.25
  circle w2.5: c-25.48,8 r1.25
  circle w2.5: c-4.48,8 r1.25
  circle w2.5: c25.52,8 r1.25
  circle w2.5: c25.52,-8 r1.25
  circle w2.5: c4.52,-8 r1.25
Mechanical 1:
  lines w0.3: -56,-51 -56,67 56,67 56,-51 -56,-51 ; -44,-37 ccw(c-42,-37) -42,-39 42,-39 ccw(c42,-37) 44,-37 44,53 ccw(c42,53) 42,55 -42,55 ccw(c-42,53) -44,53 -44,-37 ; -35,-37 -35,37 35,37 35,-37 -35,-37
Mechanical 2:
  lines w0.3: 40.993,43.507 54.243,56.757 ccw(c50,61) 45.757,65.243 19.015,38.5 -19.015,38.5 -45.757,65.243 ccw(c-50,61) -54.243,56.757 -41,43.515 -41,-27.515 -54.243,-40.757 ccw(c-50,-45) -45.757,-49.243 -35.015,-38.5 35.015,-38.5 45.757,-49.243 ccw(c50,-45) 54.243,-40.757 41,-27.515 41,43.507 ; -29,-24.5 ccw(c-27,-24.5) -27,-26.5 27,-26.5 ccw(c27,-24.5) 29,-24.5 29,24.5 ccw(c27,24.5) 27,26.5 -27,26.5 ccw(c-27,24.5) -29,24.5 -29,-24.5
3D body: height 23, standoff -10.5, extent -56,-51 56,67

## USB1X04SR [mm]
height 6.9
pads (6):
  round 3.5 hole 2.3: 0(-6.57,-1.355) 0(6.57,-1.355)
  round 1.7 hole 1 mask+0.1: 1(-3.5,1.355) 2(-1,1.355) 3(1,1.355) 4(3.5,1.355)
Top Overlay:
  lines w0.3: -7.056,-8.551 -7.056,-3.725 ; -7.056,0.974 -7.056,2.625 7.041,2.625 7.041,0.974 ; 7.041,-8.551 7.041,-3.725
Mechanical 1:
  lines w0.2: -8.126,-2.068 -6.57,-2.321 ; -8.126,-0.662 -6.573,-0.41 ; -8.123,-2.048 -8.123,-0.682 ; -6.253,-11.025 cw(c-6.873,-11.025) -6.873,-11.645 -7.318,-11.645 -7.318,-11.327 -6.873,-11.327 ccw(c-6.873,-11.025) -6.571,-11.025 ; -5.933,-11.025 -5.933,2.355 ; -5.613,-11.327 5.601,-11.327 ; -4.215,-3.665 -3.587,-8.585 ; -2.425,-8.585 -1.796,-3.665 ; 1.785,-3.665 2.413,-8.585 ; 3.575,-8.585 4.204,-3.665 ; 5.921,-11.025 5.921,2.355 ; 6.241,-11.025 ccw(c6.861,-11.025) 6.861,-11.645 7.306,-11.645 7.306,-11.327 6.861,-11.327 cw(c6.861,-11.025) 6.559,-11.025 ; 6.558,-2.321 8.115,-2.068 ; 6.561,-0.41 8.115,-0.662 ; 8.111,-2.048 8.111,-0.682 ; -6.571,-11.025 -5.613,-11.025 -5.613,-11.645 5.601,-11.645 5.601,-11.025 6.559,-11.025 ; -6.571,-11.025 -6.571,2.355 6.559,2.355 6.559,-11.025 ; -4.76,-3.665 -3.901,-10.081 ccw(c-3.006,-9.961) -2.11,-10.081 -1.251,-3.665 -4.76,-3.665 ; -3.564,-8.583 -3.406,-9.758 -2.606,-9.758 -2.447,-8.583 -3.564,-8.583 ; 1.24,-3.665 4.749,-3.665 3.89,-10.081 cw(c2.994,-9.961) 2.099,-10.081 1.24,-3.665 ; 2.436,-8.583 2.594,-9.758 3.394,-9.758 3.553,-8.583 2.436,-8.583
  text ".Designator" at -3.102,-1.693 h1.5
3D body: height 7.25, standoff -4.02, extent -8.141,-11.67 8.091,2.33

## USB2X02SR [mm]
height 10.85
pads (6):
  round 1.5 hole 0.8: 1(1.25,4.7) 2(-1.25,4.7) 3(-1.25,2.7) 4(1.25,2.7)
  round 3.4 hole 2.2: K1(6,0) K2(-6,0)
Top Overlay:
  lines w0.25: -6,2.3 -6,7 6,7 6,2.3
Mechanical 1:
  lines w0.3: -6,-10.28 6,-10.28 6,6.72 -6,6.72 -6,-10.28
3D body: height 11, standoff -4.22, extent -7.43,-10.285 7.43,6.715

## USB AR [mm]
height 3
pads (8):
  round 1.5 hole 0.8: 1(3.5,2.1) 2(1,2.1) 3(-1,2.1) 4(-3.5,2.1)
  round 3.4 hole 2.2: K1(5.7,0) K2(-5.7,0)
  round 1 hole 1 unplated: MH1(2.25,0) MH2(-2.25,0)
Top Overlay:
  lines w0.25: -6,-2.3 6,-2.3 ; -6,2.3 -6,3.5 6,3.5 6,2.3
Mechanical 1:
  lines w0.3: -6,-2.75 6,-2.75 ; -6,-17.8 -6,1 6,1 6,-17.8 -6,-17.8
3D body: height 3.1, standoff -2.87, extent -6.348,-17.8 6.35,2.225

## USB B - 67171 [mm]
height 15.6
pads (6):
  round 1.5 hole 0.8: 1(1.25,1.6) 2(-1.25,1.6) 3(-1.25,-1.6) 4(1.25,-1.6)
  round 3.5 hole 2.3: K1(6,-1.11) K2(-6,-1.11)
Top Overlay:
  lines w0.25: -6.5,-3.5 -6.5,-5.9 6.5,-5.9 6.5,-3.5 ; -6.5,1 -6.5,5.9 6.5,5.9 6.5,1
Mechanical 1:
  lines w0.3: -6,-5.4 -6,5.4 6,5.4 6,-5.4 -6,-5.4
3D body: height 15.6, standoff -4.6, extent -6,-5.4 6,5.4